# Altium footprint library PCBLIB.PcbLib: 775 footprints (part 5 of 49)
Each footprint in its own frame and in the unit in brackets; x right, y up, seen from the top. Pads: shape width x height; smd on the part's side, far side on the other; paste and mask are expansions set on the pad; w line width, h text height; cw(c..) or ccw(c..) is an arc to the next point about the centre after c.
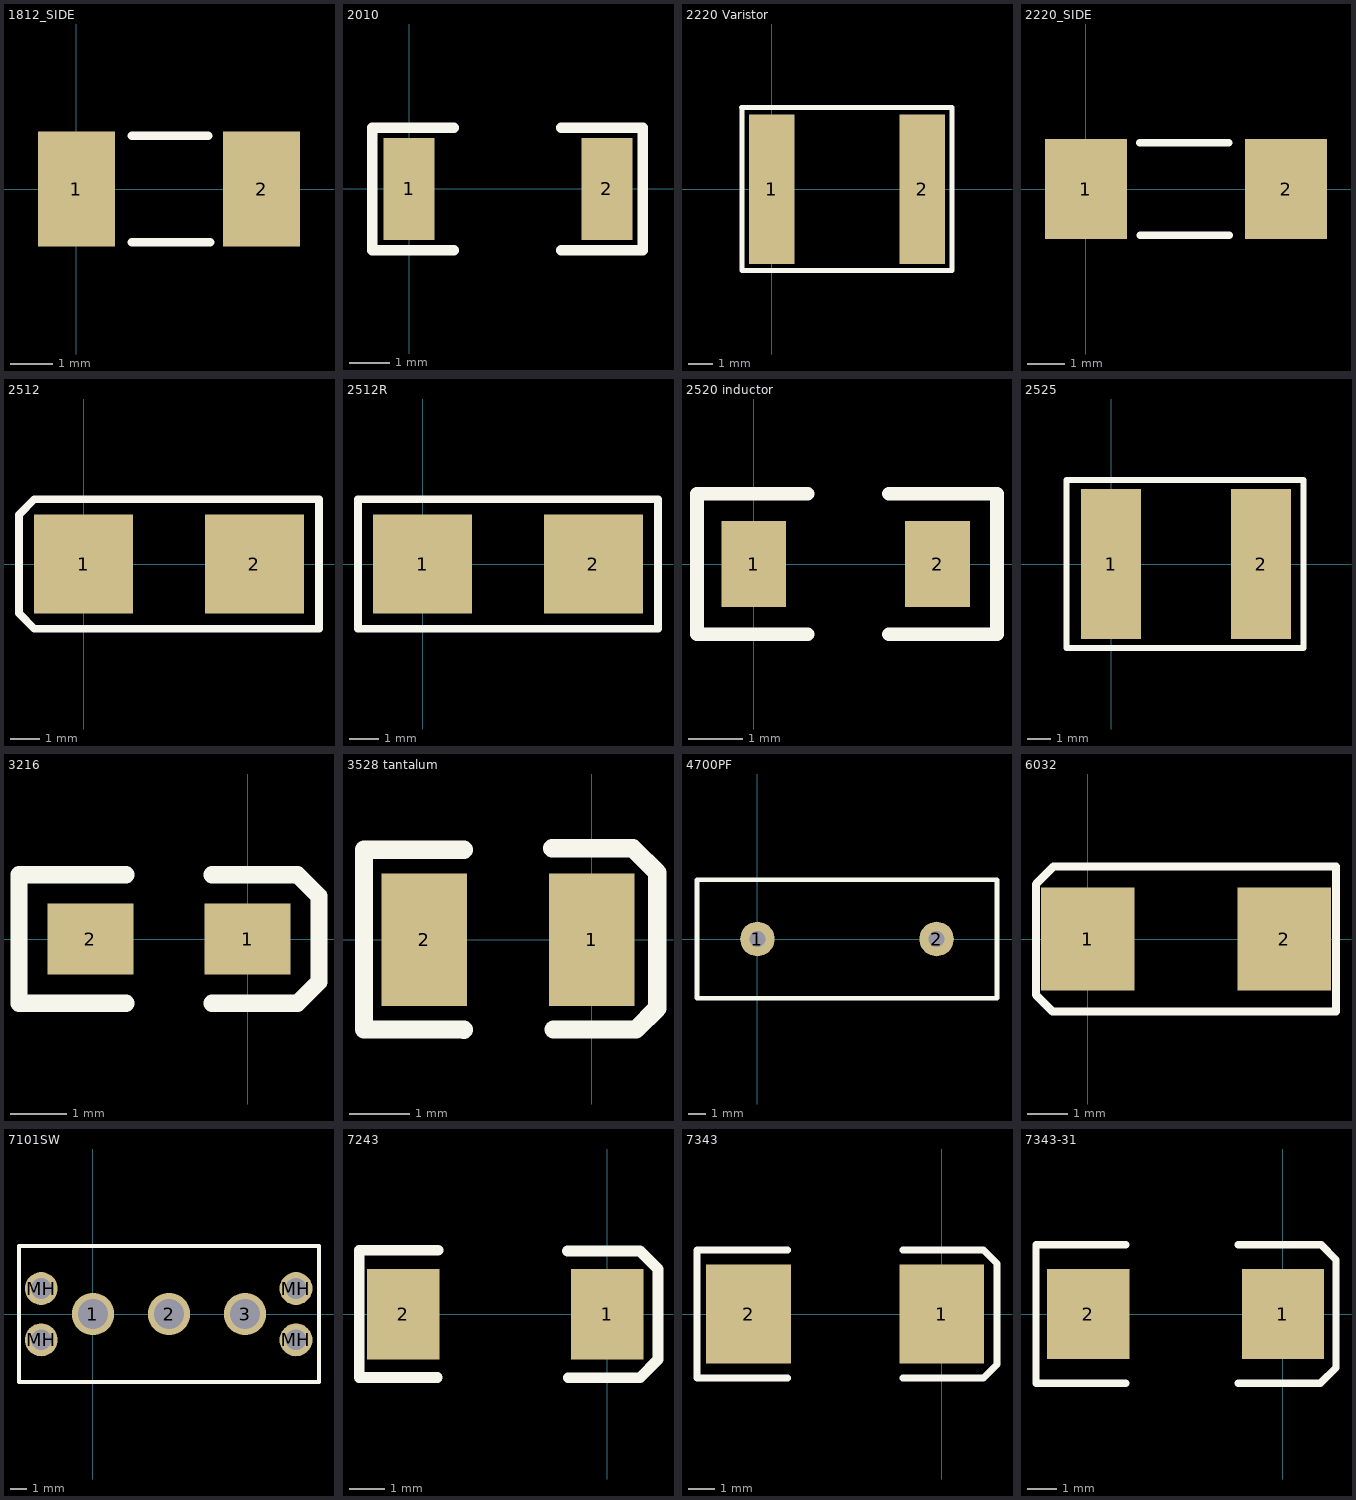
[diagram p4: the footprints below, top view; thin cyan lines are the x and y axes]

## 1812_SIDE [mm] "Chip Capacitor, 2-Leads, Body 4.5x2.5mm, IPC Medium Density"
height 3.5
pads (2):
  rect 1.8x2.692 smd: 1(0,0) 2(4.34,0)
TopOverlay:
  lines w0.2: 1.3,-1.25 3.141,-1.252 ; 1.3,1.25 3.094,1.243

## 2010 [mil]
pads (2):
  rect 50x100 smd: 1(0,0) 2(194,0)
TopOverlay:
  lines w10: 44,-60 -36,-60 -36,60 44,60 ; 149,-60 229,-60 229,60 149,60
Mechanical4:
  text ".110" at 194,0 h1

## 2220 Varistor [mil]
height 118
pads (2):
  rect 73x240 smd: 1(0,0) 2(242,0)
TopOverlay:
  lines w8: -48.55,131.59 289.57,131.59 289.57,-130.75 -47.91,-130.75 -47.91,130.95 -48.55,131.59
Mechanical4:
  text ".110" at 0,0 h1

## 2220_SIDE [mil]
height 137.8
pads (2):
  rect 87.09x106 smd: 1(0,0) 2(213.09,0)
TopOverlay:
  lines w7.87: 57.47,49.21 151.96,49.21 ; 57.93,-49.25 152.42,-49.25

## 2512 [mil]
height 60
pads (2):
  rect 130x130 smd: 1(0,0) 2(225,0)
TopOverlay:
  lines w10: -85,-65 -65,-85 310,-85 310,85 -65,85 -85,65 -85,-65
Mechanical4:
  text ".110" at 0,0 h1

## 2512R [mil]
pads (2):
  rect 130x130 smd: 1(0,0) 2(225,0)
TopOverlay:
  lines w10: -85,-85 310,-85 310,85 -85,85 -85,-85
Mechanical4:
  text ".110" at 0,0 h1

## 2520 inductor [mm]
pads (2):
  rect 1.2x1.6 smd: 1(0,0) 2(3.4,0)
TopOverlay:
  lines w0.254: 1,-1.3 -1.05,-1.3 -1.05,1.3 1,1.3 ; 2.5,-1.3 4.5,-1.3 4.5,1.3 2.5,1.3

## 2525 [mil]
pads (2):
  rect 100x250 smd: 1(0,0) 2(250,0)
TopOverlay:
  lines w10: -74,-140 -74,140 321,140 321,-140 -74,-140
Mechanical4:
  text ".110" at 0,0 h1

## 3216 [mil]
height 35
pads (2):
  rect 60x50 smd: 1(0,0) 2(-110,0)
TopOverlay:
  lines w12: -85,-45 -160,-45 -160,45 -85,45 ; -25,-45 35,-45 50,-30 50,30 35,45 -25,45
Mechanical4:
  text ".1" at 0,0 h1

## 3528 tantalum [mil]
height 80
pads (2):
  rect 56x87 smd: 1(0,0) 2(-110,0)
TopOverlay:
  lines w12: -84,-59.06 -149.61,-59 -149.61,59.06 -84,59.06 ; -26,60 27,60 43,44 43,-45 29,-59 -25,-59
Mechanical4:
  text ".1" at 0,0 h1
3D body: height 39.45, standoff 0, extent -118.99,-32 6.99,31

## 4700PF [mil]
pads (2):
  round 76 hole 36: 1(0,0) 2(394,0)
TopOverlay:
  lines w10: 487,130 527,130 527,-130 490,-130 -3,-130 -133,-130 -133,130 -3,130 490,130

## 6032 [mil]
height 98.43
pads (2):
  rect 90x100 smd: 1(0,0) 2(190,0)
TopOverlay:
  lines w8: -50,-54 -50,53 -33,70 240,70 240,-70 -34,-70 -50,-54

## 7101SW [mil]
pads (7):
  round 103 hole 73: 1(0,0) 2(185,0) 3(370,0)
  round 80 hole 50: MH(-126,-63) MH(-126,62) MH(494,-63) MH(494,62)
TopOverlay:
  lines w10: -180,-165 550,-165 550,165 -180,165 -180,-165
Mechanical4:
  text ".400" at 0,0 h1

## 7243 [mil]
pads (2):
  rect 80x100 smd: 1(0,0) 2(-225,0)
TopOverlay:
  lines w12: -273.59,-69.69 -187.59,-69.69 ; -273.59,-69.24 -273.59,70.76 -186.59,70.76 ; -44,70 36,70 56,50 56,-50 36,-70 -43,-70
Mechanical4:
  text ".1" at 0,0 h1

## 7343 [mm]
height 3.175
pads (2):
  rect 3.2x3.75 smd: 1(0,0) 2(-7.3,0)
TopOverlay:
  lines w0.254: -5.817,-2.413 -9.246,-2.413 -9.246,2.413 -5.817,2.413 ; -1.473,-2.413 1.575,-2.413 2.083,-1.905 2.083,-1.854 2.083,1.854 2.083,1.905 1.575,2.413 -1.473,2.413
Mechanical4:
  text ".1" at 0.432,0 h0.03
  text ".1" at -0.33,0 h0.03

## 7343-31 [mil]
height 125
pads (2):
  rect 110x120 smd: 1(0,0) 2(-260,0)
TopOverlay:
  lines w10: -210,-92.5 -330,-92.5 -330,92.5 -210,92.5 ; -60,-92.5 50,-92.5 70.95,-71.55 70.95,72.31 50.95,92.31 ; -60,92.5 50,92.5
Mechanical4:
  text ".1" at 17,0 h1
  text ".1" at -13,0 h1